# Altium footprint library THU.PcbLib: 477 footprints (part 29 of 30)
Each footprint in its own frame and in the unit in brackets; x right, y up, seen from the top. Pads: shape width x height; smd on the part's side, far side on the other; paste and mask are expansions set on the pad; w line width, h text height; cw(c..) or ccw(c..) is an arc to the next point about the centre after c.
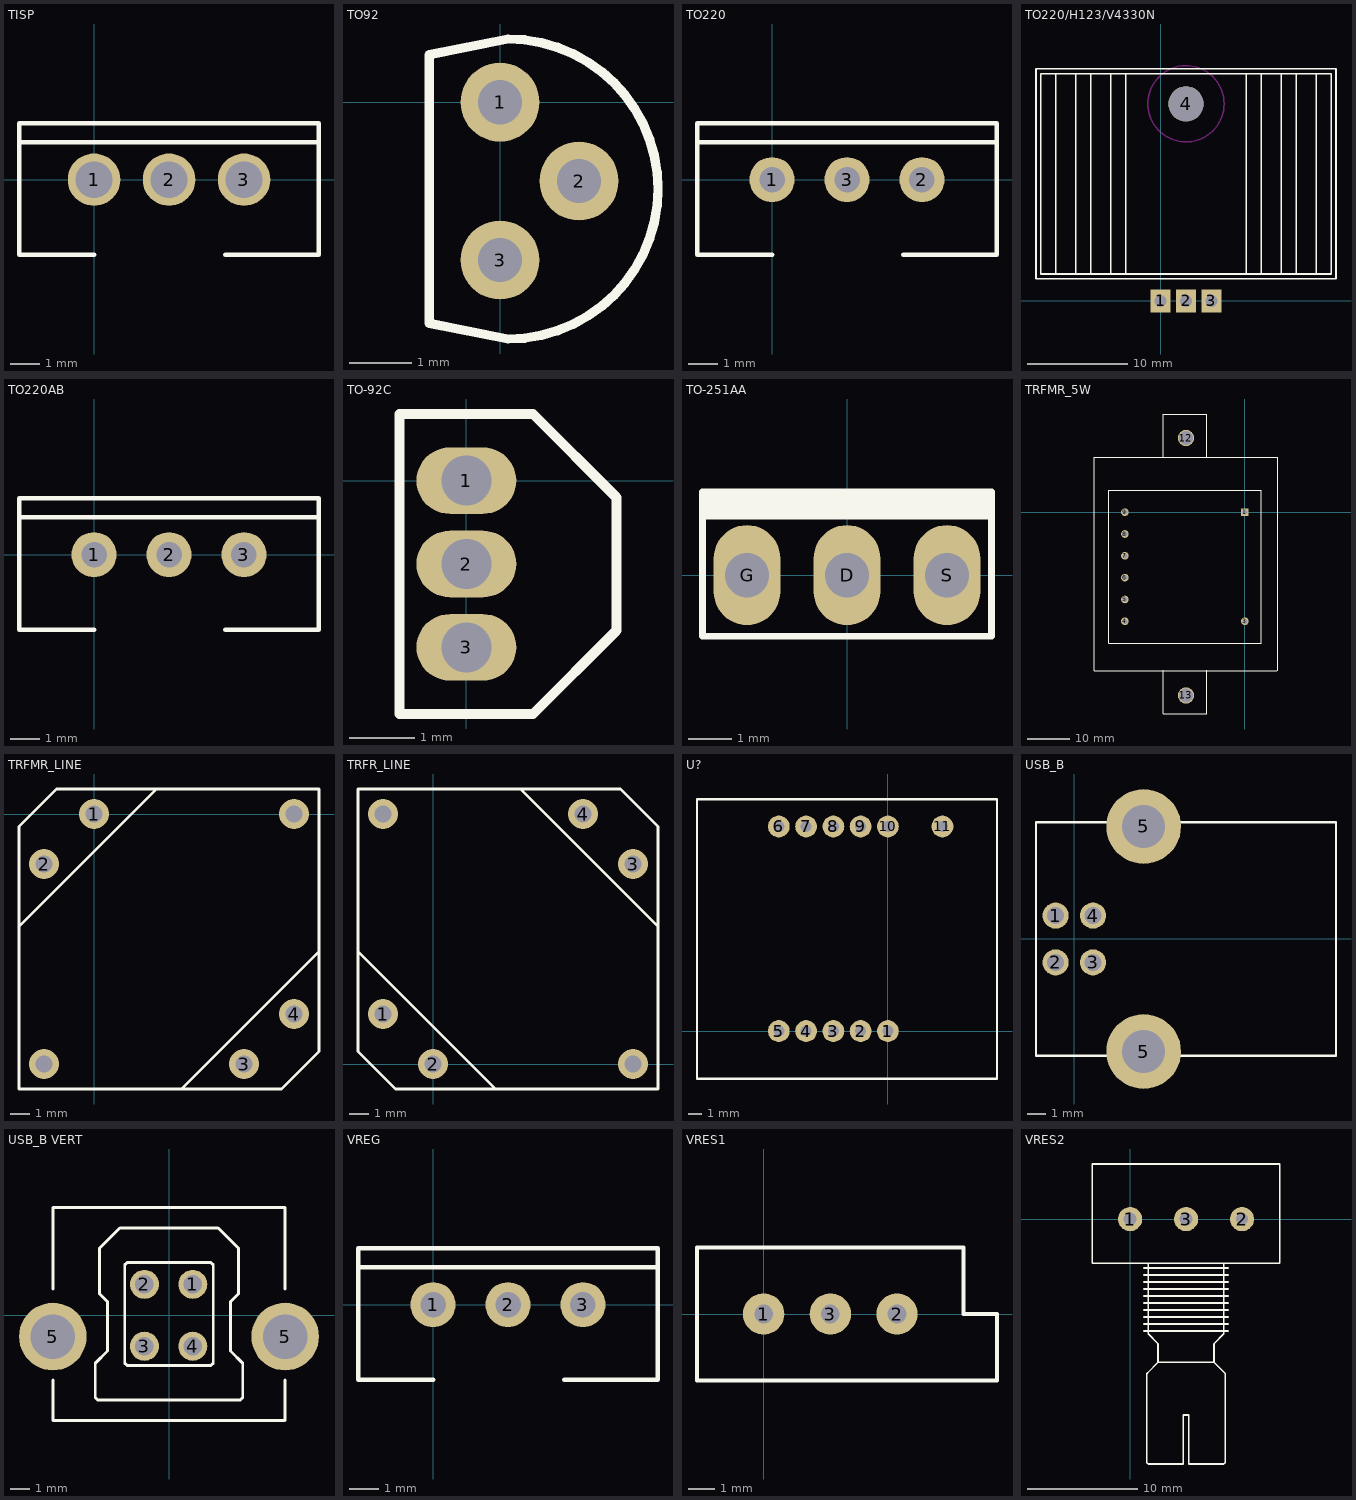
[diagram p28: the footprints below, top view; thin cyan lines are the x and y axes]

## TISP [mil]
pads (3):
  round 70 hole 49: 1(0,0) 2(100,0) 3(200,0)
TopOverlay:
  lines w6: 0,-100 -100,-100 -100,50 ; 150,50 175,50 ; 175,-100 300,-100 300,50 ; -100,50 300,50 ; -100,50 -100,75 300,75 300,50

## TO92 [mil]
pads (3):
  round 50 hole 28: 1(0,0) 2(50,-50) 3(0,-100)
TopOverlay:
  lines w6: -45,-140 -45,30 5,40 cw(c5,-55) 5,-150 -45,-140

## TO220 [mil]
pads (3):
  round 60 hole 34: 1(0,0) 2(200,0) 3(100,0)
TopOverlay:
  lines w6: 0,-100 -100,-100 -100,50 ; 150,50 175,50 ; 175,-100 300,-100 300,50 ; -100,50 -100,75 300,75 300,50 ; -100,50 300,50

## TO220/H123/V4330N [mil]
pads (4):
  rect 80x90 hole 47: 1(0,0) 2(100,0) 3(200,0)
  round 138 hole 138 unplated: 4(100,775)
TopOverlay:
  lines w6: -411.81,105.71 -411.81,893.11 ; -333.07,105.71 -333.07,893.11 ; -274.02,105.71 -274.02,893.11 ; -195.28,105.71 -195.28,893.11 ; -136.22,105.71 -136.22,893.11 ; 336.22,105.71 336.22,893.11 ; 395.28,105.71 395.28,893.11 ; 474.02,105.71 474.02,893.11 ; 533.07,105.71 533.07,893.11 ; 611.81,105.71 611.81,893.11 ; -490,87.5 690,87.5 690,912.5 -490,912.5 -490,87.5 ; -470.87,105.71 -470.87,893.11 670.87,893.11 670.87,105.71 -470.87,105.71
KeepOutLayer:
  circle w6: c100,775 r150

## TO220AB [mil]
pads (3):
  round 60 hole 34: 1(0,0) 2(100,0) 3(200,0)
TopOverlay:
  lines w6: 0,-100 -100,-100 -100,50 ; 150,50 175,50 ; 175,-100 300,-100 300,50 ; -100,50 -100,75 300,75 300,50 ; -100,50 300,50

## TO-92C [mil]
pads (3):
  oval 60x40 hole 30: 1(0,0) 2(0,-50) 3(0,-100)
TopOverlay:
  lines w6: -40,-140 -40,40 40,40 90,-10 90,-90 40,-140 -40,-140

## TO-251AA [mil]
pads (3):
  oval 60x90 hole 40: D(0,0) G(-90,0) S(90,0)
TopOverlay:
  rectangle: -130,50 130,75
  lines w6: -130,-55 -130,75 130,75 130,-55 -130,-55

## TRFMR_5W [mil]
pads (10):
  rect 70x70 hole 46: 1(0,0)
  round 70 hole 46: 3(0,-1000) 4(-1100,-1000) 5(-1100,-800) 6(-1100,-600) 7(-1100,-400) 8(-1100,-200) 9(-1100,0)
  round 150 hole 125: 12(-540,680) 13(-540,-1680)
TopOverlay:
  lines w6: -750,-1450 -750,-1850 -350,-1850 -350,-1450 ; -750,500 -750,900 -350,900 -350,500 ; 290,-1455 -1380,-1455 -1380,505 300,505 300,-1455 ; -1250,-1200 150,-1200 150,200 -1250,200 -1250,-1200

## TRFMR_LINE [mil]
pads (6):
  round 60 hole 34: 1(0,0) 2(-100,-100) 3(300,-500) 4(400,-400) ""(-100,-500) ""(400,0)
TopOverlay:
  lines w6: -150,-225 125,50 ; 175,-550 450,-275 ; -150,-550 -150,-25 -75,50 450,50 450,-475 375,-550 -150,-550

## TRFR_LINE [mil]
pads (6):
  round 60 hole 34: 1(-100,100) 2(0,0) 3(400,400) 4(300,500) ""(-100,500) ""(400,0)
TopOverlay:
  lines w6: -150,225 125,-50 ; 175,550 450,275 ; -150,25 -75,-50 450,-50 450,475 375,550 -150,550 -150,25

## U? [mm] "RF READER"
height 5.92
pads (11):
  round 1.6 hole 0.8: 1(0,0) 2(-2,0) 3(-4,0) 4(-6,0) 5(-8,0) 6(-8,15) 7(-6,15) 8(-4,15) 9(-2,15) 10(0,15) 11(4,15)
TopOverlay:
  lines w0.152: -14,-3.5 8,-3.5 8,17 -14,17 -14,-3.5

## USB_B [mm] "USB 2.0 TYPE B P/N WURTH 61400416121"
height 10.9
pads (6):
  round 1.4 hole 0.92: 1(-1,1.25) 2(-1,-1.25) 3(1,-1.25) 4(1,1.25)
  round 4 hole 2.3: 5(3.71,-6.02) 5(3.71,6.02)
TopOverlay:
  lines w0.127: 2,-6.25 -2.05,-6.25 -2.05,6.25 2,6.25 ; 5.5,-6.25 14,-6.25 14,6.25 5.5,6.25
3D body "STEP-61400416121-rev1.stp": height 11.07, standoff -3.79, extent -2.482,-7.504 14.018,7.464

## USB_B VERT [mm] "WURTH P/N: 614 004 133 21"
height 16.1
pads (6):
  round 1.5 hole 0.95: 1(1.23,1.6) 2(-1.27,1.6) 3(-1.27,-1.6) 4(1.23,-1.6)
  round 3.5 hole 2.3: 5(-6,-1.1) 5(6,-1.1)
TopOverlay:
  lines w0.152: -6,-3.35 -6,-5.433 0,-5.433 6,-5.433 6,-3.35 ; -6,1.368 -6,5.567 0,5.567 6,5.567 6,1.368 ; -3.81,-4.251 -3.81,-2.473 -3.175,-1.838 -3.175,0.702 -3.6,1.127 -3.6,1.337 -3.6,3.452 -2.54,4.512 0,4.512 2.54,4.512 3.6,3.452 3.6,1.337 3.6,1.127 3.175,0.702 3.175,-1.838 3.81,-2.473 3.81,-4.251 3.683,-4.378 0,-4.378 -3.683,-4.378 -3.81,-4.251 ; -2.286,-2.473 -2.159,-2.6 2.032,-2.6 2.159,-2.6 2.286,-2.473 2.286,2.607 2.159,2.734 -2.159,2.734 -2.286,2.607 -2.286,-2.473
3D body: height 4, standoff 0, extent -6,-5.35 6,5.65
3D body: height 16.1, standoff 0, extent -6,-5.35 6,5.65
3D body: height 16.1, standoff 0, extent -2.286,-2.517 2.286,2.817

## VREG [mil]
pads (3):
  round 60 hole 34: 1(0,0) 2(100,0) 3(200,0)
TopOverlay:
  lines w6: 0,-100 -100,-100 -100,50 ; 150,50 175,50 ; 175,-100 300,-100 300,50 ; -100,50 300,50 ; -100,50 -100,75 300,75 300,50

## VRES1 [mil] "VARIABLE RESISTOR"
pads (3):
  round 62 hole 28: 1(0,0) 2(200,0) 3(100,0)
TopOverlay:
  lines w6: -100,-100 -100,100 300,100 300,0 350,0 350,-100 -100,-100

## VRES2 [mm] "VARIABLE RESISTOR"
pads (3):
  round 2.2 hole 1.2: 1(0,0) 3(5.08,0)
  round 2.2 hole 1.1: 2(10.16,0)
TopOverlay:
  lines w0.152: 1.27,-10.16 8.89,-10.16 ; 1.27,-9.525 8.89,-9.525 ; 1.27,-8.89 8.89,-8.89 ; 1.27,-8.255 8.89,-8.255 ; 1.27,-7.62 8.89,-7.62 ; 1.27,-6.985 8.89,-6.985 ; 1.27,-6.35 8.89,-6.35 ; 1.27,-5.715 8.89,-5.715 ; 1.27,-5.08 8.89,-5.08 ; 1.27,-4.445 8.89,-4.445 ; 1.651,-4 1.651,-10.414 2.54,-11.303 2.54,-11.43 2.54,-13.005 ; 8.509,-4 8.509,-10.414 7.62,-11.303 7.62,-11.43 7.62,-13.005 ; 2.54,-13.005 7.62,-13.005 ; 2.54,-13.005 1.575,-13.97 1.524,-14.021 1.524,-22.098 1.651,-22.225 4.826,-22.225 4.826,-17.78 5.334,-17.78 5.334,-22.225 8.509,-22.225 8.636,-22.098 8.636,-14.021 8.585,-13.97 7.62,-13.005 ; -3.425,-4 13.575,-4 13.575,5 -3.425,5 -3.425,0 -3.425,-4